# Altium footprint library pre_CONNECTOR.PcbLib: 64 footprints (part 1 of 4)
Each footprint in its own frame and in the unit in brackets; x right, y up, seen from the top. Pads: shape width x height; smd on the part's side, far side on the other; paste and mask are expansions set on the pad; w line width, h text height; cw(c..) or ccw(c..) is an arc to the next point about the centre after c.
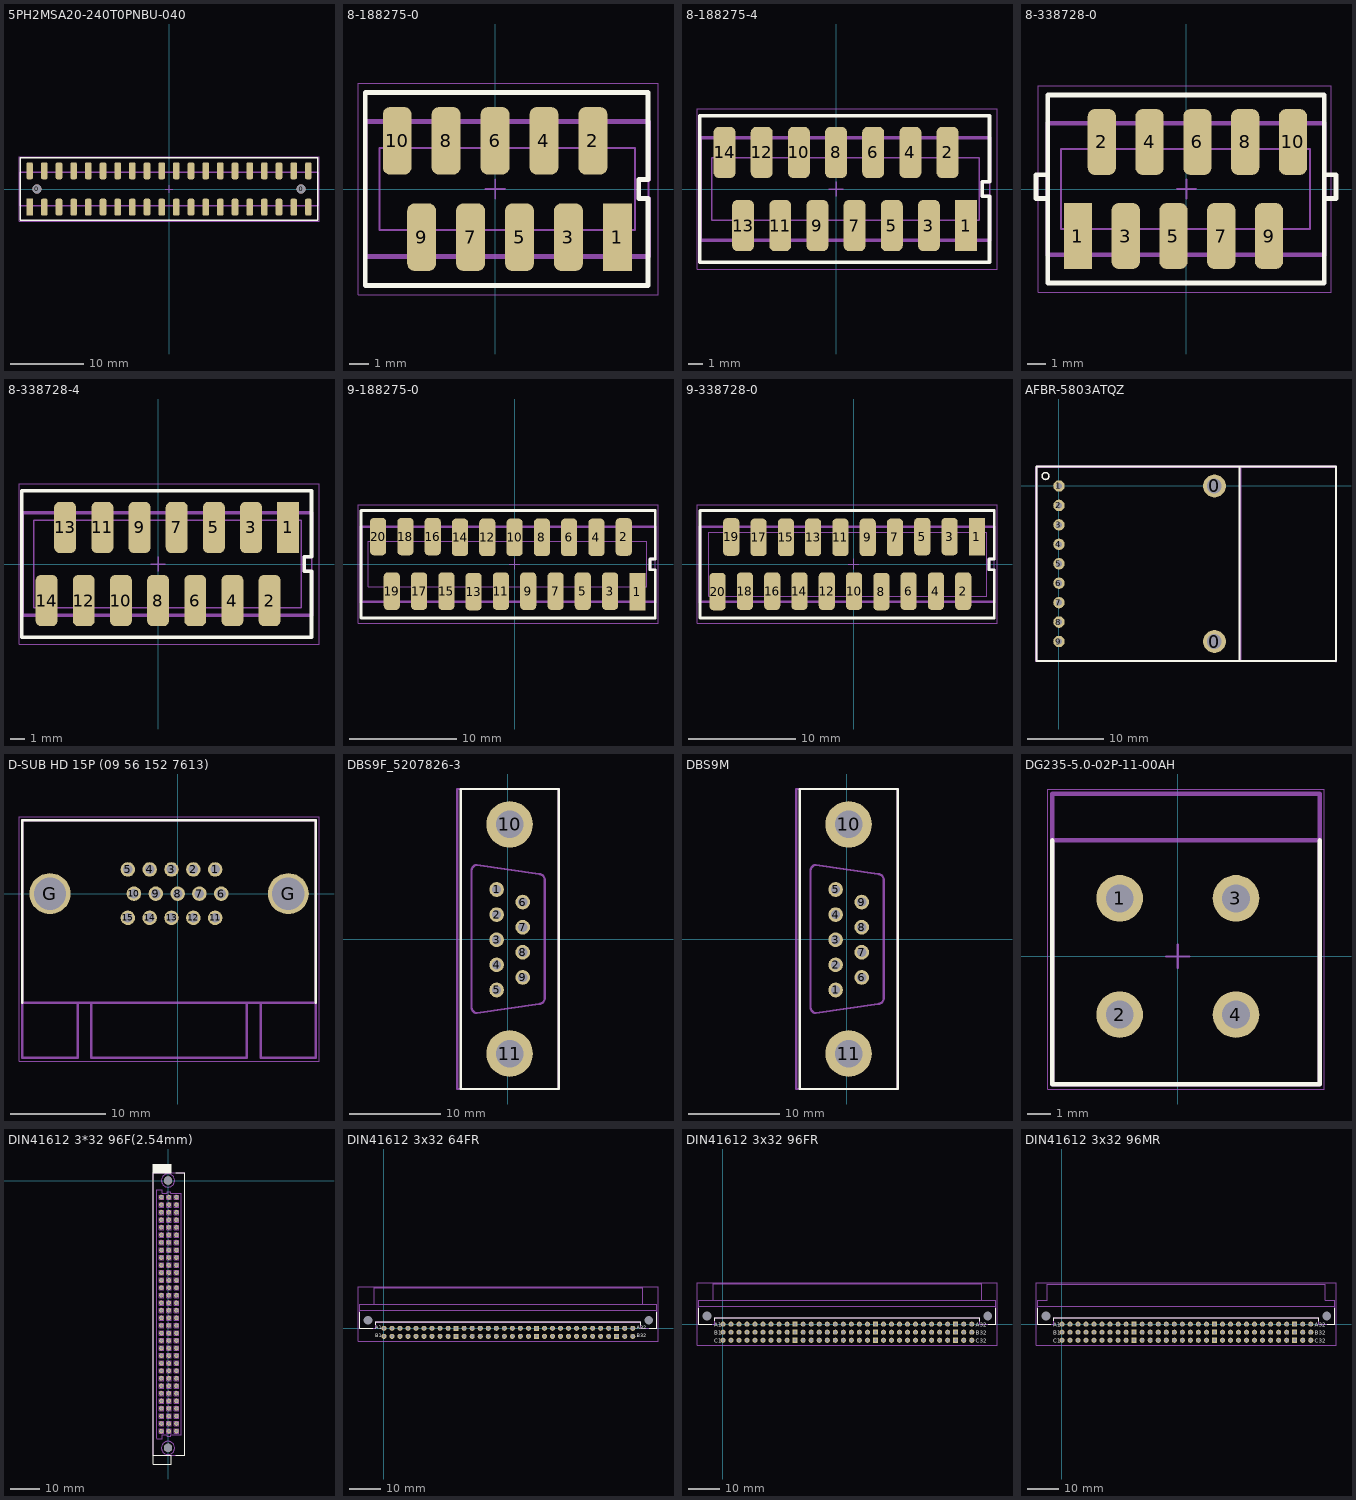
[diagram p0: the footprints below, top view; thin cyan lines are the x and y axes]

## 5PH2MSA20-240T0PNBU-040 [mm] "Female Header, Pitch 2.0mm"
height 6.7
pads (42):
  round 1.2 hole 1.2 unplated: 0(-18,0) 0(18,0)
  rect 0.9x2.3 smd: 1(-19,-2.475)
  rrect50% 0.9x2.3 smd: 2(-19,2.475) 3(-17,-2.475) 4(-17,2.475) 5(-15,-2.475) 6(-15,2.475) 7(-13,-2.475) 8(-13,2.475) 9(-11,-2.475) 10(-11,2.475) 11(-9,-2.475) 12(-9,2.475) 13(-7,-2.475) 14(-7,2.475) 15(-5,-2.475) 16(-5,2.475) 17(-3,-2.475) 18(-3,2.475) 19(-1,-2.475) 20(-1,2.475) 21(1,-2.475) 22(1,2.475) 23(3,-2.475) 24(3,2.475) 25(5,-2.475) 26(5,2.475) 27(7,-2.475) 28(7,2.475) 29(9,-2.475) 30(9,2.475) 31(11,-2.475) 32(11,2.475) 33(13,-2.475) 34(13,2.475) 35(15,-2.475) 36(15,2.475) 37(17,-2.475) 38(17,2.475) 39(19,-2.475) 40(19,2.475)
Top Overlay:
  lines w0.2: -20.3,-4.25 20.3,-4.25 20.3,4.25 -20.3,4.25 -20.3,-4.25
Top Assy:
  lines w0.2: -20.3,-2.25 20.3,-2.25 20.3,2.25 -20.3,2.25 -20.3,-2.25
Mechanical 15:
  lines w0.05: -20.45,-4.4 20.45,-4.4 20.45,4.4 -20.45,4.4 -20.45,-4.4
  lines w0.1: -0.5,0 0.5,0 ; 0,-0.5 0,0.5
3D body: height 6.7, standoff 0, extent -20.3,-2.25 20.3,2.25

## 8-188275-0 [mm]
height 5.25
pads (10):
  rect 1.5x3.5 smd: 1(6.34,-2.5)
  rrect50% 1.5x3.5 smd: 2(5.07,2.5) 3(3.8,-2.5) 4(2.53,2.5) 5(1.26,-2.5) 6(-0.01,2.5) 7(-1.28,-2.5) 8(-2.55,2.5) 9(-3.82,-2.5) 10(-5.09,2.5)
Top Overlay:
  lines w0.254: -6.75,-5 -6.75,5 7.94,5 7.94,0.5 7.45,0.5 7.45,-0.5 7.94,-0.5 7.94,-5 -6.75,-5
Top Assy:
  lines w0.254: -6.75,-3.5 -6.75,3.5 7.95,3.5 7.95,1 7.95,0.5 7.45,0.5 7.45,-0.5 7.95,-0.5 7.95,-3.5 -6.75,-3.5
Mechanical 13:
  lines w0.1: 7.25,-2.13 -6,-2.13 -6,2.13 7.25,2.13 ; 7.25,-2.125 7.25,2.125 ; -6.725,-3.5 7.95,-3.5 7.95,3.5 -6.725,3.5 -6.725,-3.5
Mechanical 15:
  lines w0.05: -7.125,-5.5 8.45,-5.5 8.45,5.5 -7.125,5.5 -7.125,-5.5
  lines w0.1: -0.5,0 0.5,0 ; 0,-0.5 0,0.5
3D body: height 3.35, standoff 0, extent -6.75,-3.5 7.95,3.5
3D body: height 5.25, standoff 3.35, extent -6,-2.125 7.25,2.125

## 8-188275-4 [mm]
height 5.25
pads (14):
  rect 1.5x3.5 smd: 1(8.89,-2.5)
  rrect50% 1.5x3.5 smd: 2(7.62,2.5) 3(6.35,-2.5) 4(5.08,2.5) 5(3.81,-2.5) 6(2.54,2.5) 7(1.27,-2.5) 8(0,2.5) 9(-1.27,-2.5) 10(-2.54,2.5) 11(-3.81,-2.5) 12(-5.08,2.5) 13(-6.35,-2.5) 14(-7.62,2.5)
Top Overlay:
  lines w0.254: -9.31,-5 -9.31,5 10.49,5 10.49,0.5 10,0.5 10,-0.5 10.49,-0.5 10.49,-5 -9.31,-5
Top Assy:
  lines w0.254: -9.3,-3.5 -9.3,3.5 10.5,3.5 10.5,1 10.5,0.5 10,0.5 10,-0.5 10.5,-0.5 10.5,-3.5 -9.3,-3.5
Mechanical 13:
  lines w0.1: -8.5,-2.13 9.8,-2.13 ; -8.5,-2.125 -8.5,2.13 9.8,2.13 ; 9.8,-2.125 9.8,2.125 ; -9.3,-3.5 10.5,-3.5 10.5,3.5 -9.3,3.5 -9.3,-3.5
Mechanical 15:
  lines w0.05: -9.5,-5.5 11,-5.5 11,5.5 -9.5,5.5 -9.5,-5.5
  lines w0.1: -0.5,0 0.5,0 ; 0,-0.5 0,0.5
3D body: height 5.25, standoff 3.35, extent -8.5,-2.125 9.8,2.125
3D body: height 3.35, standoff 0, extent -9.3,-3.5 10.5,3.5

## 8-338728-0 [mm]
pads (10):
  rect 1.5x3.5 smd: 1(-5.77,-2.5)
  rrect50% 1.5x3.5 smd: 2(-4.5,2.5) 3(-3.23,-2.5) 4(-1.96,2.5) 5(-0.69,-2.5) 6(0.58,2.5) 7(1.85,-2.5) 8(3.12,2.5) 9(4.39,-2.5) 10(5.66,2.5)
Top Overlay:
  lines w0.25: -7.37,-0.5 -8,-0.5 -8,0.75 -7.37,0.75 ; 7.32,-0.5 7.95,-0.5 7.95,0.75 7.32,0.75
  lines w0.254: -7.37,-5 7.32,-5 7.32,5 -7.37,5 -7.37,0.5 -7.37,-0.5 -7.37,-5
Top Assy:
  lines w0.254: -7.38,-3.5 -7.38,-0.5 -7.38,0.5 -7.38,1 -7.38,3.5 7.32,3.5 7.32,-3.5 -7.38,-3.5
Mechanical 13:
  lines w0.1: -6.68,-2.13 6.57,-2.13 6.57,2.13 -6.68,2.13 ; -6.68,-2.125 -6.68,2.125 ; -7.38,-3.5 -7.38,3.5 7.295,3.5 7.295,-3.5 -7.38,-3.5
Mechanical 15:
  lines w0.05: -7.88,-5.5 -7.88,5.5 7.695,5.5 7.695,-5.5 -7.88,-5.5
  lines w0.1: -0.5,0 0.5,0 ; 0,-0.5 0,0.5
3D body "c-8-338728-0-e-3d.stp": height 4.6, standoff 0, extent -7.94,-3.25 7.94,3.25

## 8-338728-4 [mm]
height 4.6
pads (14):
  rect 1.5x3.5 smd: 1(8.895,2.5)
  rrect50% 1.5x3.5 smd: 2(7.625,-2.5) 3(6.355,2.5) 4(5.085,-2.5) 5(3.815,2.5) 6(2.545,-2.5) 7(1.275,2.5) 8(0.005,-2.5) 9(-1.265,2.5) 10(-2.535,-2.5) 11(-3.805,2.5) 12(-5.075,-2.5) 13(-6.345,2.5) 14(-7.615,-2.5)
Top Overlay:
  lines w0.254: -9.31,-5 10.49,-5 10.49,-0.5 10,-0.5 10,0.5 10.49,0.5 10.49,5 -9.31,5 -9.31,-5
Top Assy:
  lines w0.254: -9.3,-3.5 10.5,-3.5 10.5,-0.5 10,-0.5 10,0.5 10.5,0.5 10.5,1 10.5,3.5 -9.3,3.5 -9.3,-3.5
Mechanical 13:
  lines w0.1: -9.3,-3.5 -9.3,3.5 10.5,3.5 10.5,-3.5 -9.3,-3.5 ; -8.5,-3 9.8,-3 9.8,3 -8.5,3 -8.5,-3
Mechanical 15:
  lines w0.05: -9.5,-5.5 -9.5,5.5 11,5.5 11,-5.5 -9.5,-5.5
  lines w0.1: -0.5,0 0.5,0 ; 0,-0.5 0,0.5
3D body: height 5.25, standoff 3.35, extent -9.3,-3.5 10.5,-3
3D body: height 5.25, standoff 3.35, extent 9.8,-3 10.5,3
3D body: height 5.25, standoff 3.35, extent -9.3,3 10.5,3.5
3D body: height 5.25, standoff 3.35, extent -9.3,-3 -8.5,3
3D body: height 2.4, standoff 0, extent -9.3,-3.5 10.5,3.5

## 9-188275-0 [mm]
height 5.25
pads (20):
  rect 1.5x3.5 smd: 1(11.43,-2.54)
  rrect50% 1.5x3.5 smd: 2(10.16,2.54) 3(8.89,-2.5) 4(7.62,2.5) 5(6.35,-2.5) 6(5.08,2.5) 7(3.81,-2.5) 8(2.54,2.5) 9(1.27,-2.5) 10(0,2.5) 11(-1.27,-2.5) 12(-2.54,2.5) 13(-3.81,-2.54) 14(-5.08,2.5) 15(-6.35,-2.5) 16(-7.62,2.58) 17(-8.89,-2.5) 18(-10.16,2.58) 19(-11.43,-2.5) 20(-12.7,2.58)
Top Overlay:
  lines w0.254: -14.3,-5 -14.3,5 13.1,5 13.1,0.5 12.6,0.5 12.6,-0.5 13.1,-0.5 13.1,-5 -14.3,-5
Top Assy:
  lines w0.254: -14.3,-3.5 -14.3,3.5 13.1,3.5 13.1,0.5 12.6,0.5 12.6,-0.5 13.1,-0.5 13.1,-3.5 -14.3,-3.5
Mechanical 13:
  lines w0.1: -14.325,-3.475 13.075,-3.475 13.075,3.525 -14.325,3.525 -14.325,-3.475 ; -13.6,-2.105 12.325,-2.105 12.325,2.155 -13.6,2.155 -13.6,-2.105
Mechanical 15:
  lines w0.05: -14.575,-5.475 13.35,-5.475 13.35,5.525 -14.575,5.525 -14.575,-5.475
  lines w0.1: -0.5,0.025 0.5,0.025 ; 0,-0.475 0,0.525
3D body: height 5.25, standoff 3.35, extent -13.6,-2.1 12.325,2.15
3D body: height 3.35, standoff 0, extent -14.3,-3.475 13.075,3.525

## 9-338728-0 [mm]
height 4.6
pads (20):
  rect 1.5x3.5 smd: 1(11.475,2.58)
  rrect50% 1.5x3.5 smd: 2(10.205,-2.5) 3(8.935,2.58) 4(7.665,-2.5) 5(6.395,2.58) 6(5.125,-2.5) 7(3.855,2.5) 8(2.585,-2.54) 9(1.315,2.5) 10(0.045,-2.5) 11(-1.225,2.5) 13(-3.765,2.5) 14(-5.035,-2.5) 15(-6.305,2.5) 16(-7.575,-2.5) 17(-8.845,2.5) 18(-10.115,-2.5) 19(-11.385,2.54) 20(-12.655,-2.54)
  rrect50% 1.5x3.5 smd paste+0: 12(-2.495,-2.5)
Top Overlay:
  lines w0.254: -14.3,-5 13.1,-5 13.1,-0.5 12.6,-0.5 12.6,0.5 13.1,0.5 13.1,5 -14.3,5 -14.3,-5
Top Assy:
  lines w0.254: -14.3,-3.5 13.1,-3.5 13.1,-0.5 12.6,-0.5 12.6,0.5 13.1,0.5 13.1,3.5 -14.3,3.5 -14.3,-3.5
Mechanical 13:
  lines w0.1: -14.325,-3.475 -14.325,3.525 13.075,3.525 13.075,-3.475 -14.325,-3.475 ; -13.5,-3 12.375,-3 12.375,3 -13.5,3 -13.5,-3
Mechanical 15:
  lines w0.05: -14.575,-5.475 -14.575,5.525 13.35,5.525 13.35,-5.475 -14.575,-5.475
  lines w0.1: -0.5,0.025 0.5,0.025 ; 0,-0.475 0,0.525
3D body: height 5.25, standoff 3.35, extent -14.275,-3.5 13.075,-3
3D body: height 5.25, standoff 3.35, extent 12.35,-3 13.05,3
3D body: height 5.25, standoff 3.35, extent -14.3,3 13.1,3.5
3D body: height 5.25, standoff 3.35, extent -14.3,-3 -13.5,3
3D body: height 2.4, standoff 0, extent -14.275,-3.5 13.05,3.5

## AFBR-5803ATQZ [mm] "D?"
height 11.1
pads (11):
  round 3 hole 1.9: 0(20.32,-20.32) 0(20.32,0)
  round 1.5 hole 0.8: 1(0,0) 2(0,-2.54) 3(0,-5.08) 4(0,-7.62) 5(0,-10.16) 6(0,-12.7) 7(0,-15.24) 8(0,-17.78) 9(0,-20.32)
Top Overlay:
  circle w0.2: c-1.75,1.3 r0.45
  lines w0.254: 23.59,-22.85 23.59,2.54 ; -2.93,-22.86 36.18,-22.86 36.19,-22.85 36.19,2.54 -2.92,2.54 -2.92,-22.85 ; -2.93,-22.86 -2.92,-22.85 ; -2.93,-22.86 -2.92,-22.85
Top Assy:
  lines w0.254: 36.175,-22.875 -2.925,-22.875 -2.925,2.525 36.175,2.525 ; 36.2,-22.925 36.2,2.475
Mechanical 13:
  lines w0.25: 23.75,-22.75 23.75,2.54 ; -3,-22.86 -3,-16.52 -3,-3.84 -3,2.5 36.2,2.5 36.2,-22.86 -3,-22.86
3D body: height 11.1, standoff 0, extent -2.9,-22.8 36.2,2.5

## D-SUB HD 15P (09 56 152 7613) [mm] "D-SUB HD 15P (09 56 152 7613)"
height 12.55
pads (17):
  round 1.524 hole 1: 1(3.94,2.54) 2(1.65,2.54) 3(-0.64,2.54) 4(-2.93,2.54) 5(-5.22,2.54) 6(4.58,0) 7(2.29,0) 8(0,0) 9(-2.29,0) 10(-4.58,0) 11(3.94,-2.54) 12(1.65,-2.54) 13(-0.64,-2.54) 14(-2.93,-2.54) 15(-5.22,-2.54)
  round 4.3 hole 3.4: G(-13.39,0) G(11.61,0)
Top Overlay:
  lines w0.254: -16.29,-11.43 -16.29,7.695 14.51,7.695 14.51,-11.43
Top Assy:
  lines w0.254: -16.29,-11.43 14.51,-11.43 ; -16.29,7.665 -16.29,-17.23 -10.49,-17.23 -10.49,-11.43 ; -16.24,7.685 14.485,7.685 14.51,7.66 14.51,-17.23 8.71,-17.23 8.71,-11.43 7.27,-11.43 7.27,-17.23 -9.05,-17.23 -9.05,-11.43 ; -10.48,-11.43 -9.04,-11.43
Mechanical 13:
  lines w0.254: -16.29,-11.43 -10.49,-11.43 -10.49,-17.23 -16.29,-17.23 -16.29,-11.43 ; -16.29,-11.43 14.51,-11.43 ; -16.29,-11.43 -16.29,7.695 14.51,7.695 14.51,-11.43 ; 14.51,-11.43 14.51,-17.23 8.71,-17.23 8.71,-11.43 14.51,-11.43 ; -9.04,-17.23 -9.04,-11.43 7.26,-11.43 7.26,-17.205 7.285,-17.23 -9.04,-17.23
Mechanical 15:
  lines w0.05: -16.64,-17.58 -16.64,8.07 14.835,8.07 14.835,-17.58 -16.64,-17.58
3D body: height 12.55, standoff 0, extent -16.24,-11.455 14.51,7.67
3D body: height 8.65, standoff 3.9, extent 8.66,-17.344 14.46,-11.467
3D body: height 8.65, standoff 3.9, extent -16.217,-17.117 -10.465,-11.342
3D body: height 10.23, standoff 2.32, extent -9.04,-17.23 7.16,-11.43

## DBS9F_5207826-3 [mm]
pads (11):
  round 1.6 hole 1: 1(-1.22,5.4) 2(-1.22,2.66) 3(-1.22,-0.08) 4(-1.22,-2.82) 5(-1.22,-5.56) 6(1.62,4.03) 7(1.62,1.29) 8(1.62,-1.45) 9(1.62,-4.19)
  round 5.08 hole 3: 10(0.2,12.5) 11(0.2,-12.49)
Top Overlay:
  lines w0.25: -5.14,-16.36 -5.14,16.36 5.54,16.36 5.54,-16.36 -5.14,-16.36
Mechanical 13:
  lines w0.25: -3.353,-8.081 cw(c-3.314,-7.425) -3.97,-7.4 -3.97,7.4 cw(c-3.314,7.425) -3.353,8.081 ; -3.35,-8.08 3.41,-7.09 ; -3.35,8.08 3.41,7.09 ; 3.413,-7.091 ccw(c3.374,-6.435) 4.03,-6.41 4.03,6.41 ccw(c3.374,6.435) 3.413,7.091 ; -5.5,-16.36 5.54,-16.36 5.54,16.36 -5.5,16.36 -5.5,-16.36
3D body: height 6, standoff 0, extent -5.15,-16.3 5.55,16.4
3D body: height 12, standoff 6, extent -4,-8.15 4,8.15

## DBS9M [mm]
pads (11):
  round 1.6 hole 1: 1(-1.22,-5.56) 2(-1.22,-2.82) 3(-1.22,-0.08) 4(-1.22,2.66) 5(-1.22,5.4) 6(1.62,-4.19) 7(1.62,-1.45) 8(1.62,1.29) 9(1.62,4.03)
  round 5.08 hole 3: 10(0.2,12.5) 11(0.2,-12.49)
Top Overlay:
  lines w0.25: -5.14,-16.36 -5.14,16.36 5.54,16.36 5.54,-16.36 -5.14,-16.36
Mechanical 13:
  lines w0.25: -3.353,-8.081 cw(c-3.314,-7.425) -3.97,-7.4 -3.97,7.4 cw(c-3.314,7.425) -3.353,8.081 ; -3.35,-8.08 3.41,-7.09 ; -3.35,8.08 3.41,7.09 ; 3.413,-7.091 ccw(c3.374,-6.435) 4.03,-6.41 4.03,6.41 ccw(c3.374,6.435) 3.413,7.091 ; -5.5,-16.36 5.54,-16.36 5.54,16.36 -5.5,16.36 -5.5,-16.36
3D body: height 6, standoff 0, extent -5.15,-16.3 5.55,16.4
3D body: height 12, standoff 6, extent -4,-8.15 4,8.15

## DG235-5.0-02P-11-00AH [mm]
height 15.5
pads (4):
  round 2 hole 1.2: 1(-2.5,2.5) 2(-2.5,-2.5) 3(2.5,2.5) 4(2.5,-2.5)
Top Overlay:
  lines w0.2: -5.4,5 -5.4,-5.5 6.1,-5.5 6.1,5
Top Assy:
  lines w0.2: -5.4,5 6.1,5 ; -5.4,-5.5 6.1,-5.5 6.1,7 -5.4,7 -5.4,-5.5
Mechanical 13:
  lines w0.2: -5.4,-5.5 -5.4,7 6.1,7 6.1,-5.5 -5.4,-5.5
Mechanical 15:
  lines w0.05: -5.6,-5.7 6.3,-5.7 6.3,7.2 -5.6,7.2 -5.6,-5.7
  lines w0.1: -0.5,0 0.5,0 ; 0,-0.5 0,0.5
3D body: height 15.5, standoff 0, extent -5.5,-5.6 6.2,7.1

## DIN41612 3*32 96F(2.54mm) [mm]
pads (98):
  round 2.8 hole 2.8 unplated: 97(0,0) 98(0,-90)
  round 1.5 hole 1: a1(-2.24,-5.63) a2(-2.24,-8.17) a3(-2.24,-10.71) a4(-2.24,-13.25) a5(-2.24,-15.79) a6(-2.24,-18.33) a7(-2.24,-20.87) a8(-2.24,-23.41) a9(-2.24,-25.95) a10(-2.24,-28.49) a11(-2.24,-31.03) a12(-2.24,-33.57) a13(-2.24,-36.11) a14(-2.24,-38.65) a15(-2.24,-41.19) a16(-2.24,-43.73) a17(-2.24,-46.27) a18(-2.24,-48.81) a19(-2.24,-51.35) a20(-2.24,-53.89) a21(-2.24,-56.43) a22(-2.24,-58.97) a23(-2.24,-61.51) a24(-2.24,-64.05) a25(-2.24,-66.59) a26(-2.24,-69.13) a27(-2.24,-71.67) a28(-2.24,-74.21) a29(-2.24,-76.75) a30(-2.24,-79.29) a31(-2.24,-81.83) a32(-2.24,-84.37) b1(0.3,-5.63) b2(0.3,-8.17) b3(0.3,-10.71) b4(0.3,-13.25) b5(0.3,-15.79) b6(0.3,-18.33) b7(0.3,-20.87) b8(0.3,-23.41) b9(0.3,-25.95) b10(0.3,-28.49) b11(0.3,-31.03) b12(0.3,-33.57) b13(0.3,-36.11) b14(0.3,-38.65) b15(0.3,-41.19) b16(0.3,-43.73) b17(0.3,-46.27) b18(0.3,-48.81) b19(0.3,-51.35) b20(0.3,-53.89) b21(0.3,-56.43) b22(0.3,-58.97) b23(0.3,-61.51) b24(0.3,-64.05) b25(0.3,-66.59) b26(0.3,-69.13) b27(0.3,-71.67) b28(0.3,-74.21) b29(0.3,-76.75) b30(0.3,-79.29) b31(0.3,-81.83) b32(0.3,-84.37) c1(2.84,-5.63) c2(2.84,-8.17) c3(2.84,-10.71) c4(2.84,-13.25) c5(2.84,-15.79) c6(2.84,-18.33) c7(2.84,-20.87) c8(2.84,-23.41) c9(2.84,-25.95) c10(2.84,-28.49) c11(2.84,-31.03) c12(2.84,-33.57) c13(2.84,-36.11) c14(2.84,-38.65) c15(2.84,-41.19) c16(2.84,-43.73) c17(2.84,-46.27) c18(2.84,-48.81) c19(2.84,-51.35) c20(2.84,-53.89) c21(2.84,-56.43) c22(2.84,-58.97) c23(2.84,-61.51) c24(2.84,-64.05) c25(2.84,-66.59) c26(2.84,-69.13) c27(2.84,-71.67) c28(2.84,-74.21) c29(2.84,-76.75) c30(2.84,-79.29) c31(2.84,-81.83) c32(2.84,-84.37)
Top Overlay:
  lines w0.25: -4.91,2.56 -4.91,5.56 1.09,5.56 1.09,2.57 -4.91,2.57 ; -4.907,-92.434 -4.907,2.562 ; -4.9,-92.44 -4.9,-95.44 1.1,-95.44 1.1,-92.43 -4.9,-92.43 ; 2.586,-92.434 5.57,-92.434 5.57,2.562 2.586,2.562
  lines w1: -4.49,5.11 -4.49,2.99 -4.48,2.99 ; -4.48,5.02 0.66,5.02 0.66,4.11 -4.46,4.11 -4.46,3.15 0.67,3.15 0.67,3.1 ; -4.45,4.97 -4.43,4.97 ; 0.67,5.13 0.67,3.01 0.69,3.01
Mechanical 2:
  drawing of 207 lines, arcs and shapes, not listed
Mechanical 13:
  drawing of 417 lines, arcs and shapes, not listed
3D body "connector_a-cf96abct.stp": height 11.62, standoff -3.98, extent -4.919,-92.458 5.681,2.542

## DIN41612 3x32 64FR [mm] "96-Pin DIN Standard Right Angle Male PCB Mount Connector Розетка"
height 9.5
pads (66):
  round 0 hole 2.8 unplated mask+1.5: 0(-5.08,2.54) 0(83.82,2.54)
  round 1.6 hole 1: A1(0,0) A2(2.54,0) A3(5.08,0) A4(7.62,0) A5(10.16,0) A6(12.7,0) A7(15.24,0) A8(17.78,0) A9(20.32,0) A11(25.4,0) A12(27.94,0) A13(30.48,0) A14(33.02,0) A15(35.56,0) A16(38.1,0) A17(40.64,0) A18(43.18,0) A19(45.72,0) A21(50.8,0) A22(53.34,0) A23(55.88,0) A24(58.42,0) A25(60.96,0) A26(63.5,0) A27(66.04,0) A28(68.58,0) A29(71.12,0) A31(76.2,0) A32(78.74,0) B1(0,-2.54) B2(2.54,-2.54) B3(5.08,-2.54) B4(7.62,-2.54) B5(10.16,-2.54) B6(12.7,-2.54) B7(15.24,-2.54) B8(17.78,-2.54) B9(20.32,-2.54) B11(25.4,-2.54) B12(27.94,-2.54) B13(30.48,-2.54) B14(33.02,-2.54) B15(35.56,-2.54) B16(38.1,-2.54) B17(40.64,-2.54) B18(43.18,-2.54) B19(45.72,-2.54) B21(50.8,-2.54) B22(53.34,-2.54) B23(55.88,-2.54) B24(58.42,-2.54) B25(60.96,-2.54) B26(63.5,-2.54) B27(66.04,-2.54) B28(68.58,-2.54) B29(71.12,-2.54) B31(76.2,-2.54) B32(78.74,-2.54)
  rect 1.6x1.6 hole 1: A10(22.86,0) A20(48.26,0) A30(73.66,0) B10(22.86,-2.54) B20(48.26,-2.54) B30(73.66,-2.54)
Top Overlay:
  lines w0.2: -7.62,5 -7.62,0 -3.6,0 ; -2.54,1.06 -2.54,2 81.28,2 81.28,0.92 ; 84,0 86.36,0 86.36,5
  text "A1" at -2.8,-0.75 h2
  text "B1" at -2.8,-3.3 h2
  text "A32" at 80,-0.75 h2
  text "B32" at 80,-3.3 h2
Bottom Overlay:
  lines w0.2: -7.62,5 -7.62,0 -2.54,0 -2.54,-4.061 81.28,-4.061 81.28,0 86.36,0 86.36,5
Top Assy:
  lines w0.254: -7.625,0 -2.525,0 ; -7.62,0.025 -7.62,7.525 ; -7.62,5.7 86.36,5.7 ; -7.605,7.55 -3.125,7.55 ; -3.125,7.575 -3.125,12.75 81.85,12.75 81.85,7.55 86.36,7.55 ; -2.555,1.975 81.25,1.975 ; -2.55,0 -2.55,1.975 ; 81.275,0 81.275,1.95 ; 81.3,0 86.3,0 ; 86.36,0 86.36,7.505
Mechanical 13:
  lines w0.2: -7.62,5.7 86.36,5.7 ; -7.62,7.54 -7.62,0 -2.54,0 -2.54,2 81.28,2 81.28,0 86.36,0 86.36,7.54 81.85,7.54 ; -7.6,7.54 -3.125,7.54 ; -3.125,7.54 81.85,7.54 ; -3.125,7.54 -3.125,12.75 81.85,12.75 81.85,7.54
Mechanical 15:
  lines w0.05: -8.2,-4.028 86.725,-4.028 86.725,13.1 -8.2,13.1 -8.2,-4.028
  lines w0.1: -0.5,0.025 0.5,0.025 ; 0,-0.5 0,0.5
3D body "din_41612_female_q-64abr.stp": height 7.05, standoff -3, extent -7.484,-2.845 86.516,12.725

## DIN41612 3x32 96FR [mm] "96-Pin DIN Standard Right Angle Male PCB Mount Connector Розетка"
height 9.5
pads (98):
  round 0 hole 2.8 unplated mask+1.5: 0(-5.08,2.54) 0(83.82,2.54)
  round 1.6 hole 1: A1(0,0) A2(2.54,0) A3(5.08,0) A4(7.62,0) A5(10.16,0) A6(12.7,0) A7(15.24,0) A8(17.78,0) A9(20.32,0) A11(25.4,0) A12(27.94,0) A13(30.48,0) A14(33.02,0) A15(35.56,0) A16(38.1,0) A17(40.64,0) A18(43.18,0) A19(45.72,0) A21(50.8,0) A22(53.34,0) A23(55.88,0) A24(58.42,0) A25(60.96,0) A26(63.5,0) A27(66.04,0) A28(68.58,0) A29(71.12,0) A31(76.2,0) A32(78.74,0) B1(0,-2.54) B2(2.54,-2.54) B3(5.08,-2.54) B4(7.62,-2.54) B5(10.16,-2.54) B6(12.7,-2.54) B7(15.24,-2.54) B8(17.78,-2.54) B9(20.32,-2.54) B11(25.4,-2.54) B12(27.94,-2.54) B13(30.48,-2.54) B14(33.02,-2.54) B15(35.56,-2.54) B16(38.1,-2.54) B17(40.64,-2.54) B18(43.18,-2.54) B19(45.72,-2.54) B21(50.8,-2.54) B22(53.34,-2.54) B23(55.88,-2.54) B24(58.42,-2.54) B25(60.96,-2.54) B26(63.5,-2.54) B27(66.04,-2.54) B28(68.58,-2.54) B29(71.12,-2.54) B31(76.2,-2.54) B32(78.74,-2.54) C1(0,-5.08) C2(2.54,-5.08) C3(5.08,-5.08) C4(7.62,-5.08) C5(10.16,-5.08) C6(12.7,-5.08) C7(15.24,-5.08) C8(17.78,-5.08) C9(20.32,-5.08) C11(25.4,-5.08) C12(27.94,-5.08) C13(30.48,-5.08) C14(33.02,-5.08) C15(35.56,-5.08) C16(38.1,-5.08) C17(40.64,-5.08) C18(43.18,-5.08) C19(45.72,-5.08) C21(50.8,-5.08) C22(53.34,-5.08) C23(55.88,-5.08) C24(58.42,-5.08) C25(60.96,-5.08) C26(63.5,-5.08) C27(66.04,-5.08) C28(68.58,-5.08) C29(71.12,-5.08) C31(76.2,-5.08) C32(78.74,-5.08)
  rect 1.6x1.6 hole 1: A10(22.86,0) A20(48.26,0) A30(73.66,0) B10(22.86,-2.54) B20(48.26,-2.54) B30(73.66,-2.54) C10(22.86,-5.08) C20(48.26,-5.08) C30(73.66,-5.08)
Top Overlay:
  lines w0.2: -7.62,5 -7.62,0 -3.6,0 ; -2.54,1.06 -2.54,2 81.28,2 81.28,0.92 ; 84,0 86.36,0 86.36,5
  text "A1" at -2.8,-0.75 h1.3
  text "B1" at -2.8,-3.3 h1.3
  text "C1" at -2.8,-5.85 h1.3
  text "A32" at 80,-0.75 h1.3
  text "B32" at 80,-3.3 h1.3
  text "C32" at 80,-5.85 h1.3
Bottom Overlay:
  lines w0.2: -7.62,5 -7.62,0 -2.54,0 -2.54,-6.15 81.28,-6.15 81.28,0 86.36,0 86.36,5
Top Assy:
  lines w0.254: -7.625,0 -2.525,0 ; -7.62,0.025 -7.62,7.525 ; -7.62,5.7 86.36,5.7 ; -7.605,7.55 -3.125,7.55 ; -3.125,7.575 -3.125,12.75 81.85,12.75 81.85,7.55 86.36,7.55 ; -2.555,1.975 81.25,1.975 ; -2.55,0 -2.55,1.975 ; 81.275,0 81.275,1.95 ; 81.3,0 86.3,0 ; 86.36,0 86.36,7.505
Mechanical 13:
  lines w0.2: -7.62,5.7 86.36,5.7 ; -7.62,7.54 -7.62,0 -2.54,0 -2.54,2 81.28,2 81.28,0 86.36,0 86.36,7.54 81.85,7.54 ; -7.6,7.54 -3.125,7.54 ; -3.125,7.54 81.85,7.54 ; -3.125,7.54 -3.125,12.75 81.85,12.75 81.85,7.54
Mechanical 15:
  lines w0.05: -8.2,-6.65 86.725,-6.65 86.725,13.1 -8.2,13.1 -8.2,-6.65
  lines w0.1: -0.5,0.025 0.5,0.025 ; 0,-0.5 0,0.5
3D body: height 8.5, standoff 0, extent -3.124,7.541 81.849,12.749
3D body: height 6, standoff 0, extent 81.28,0 86.36,5.7
3D body: height 7.9, standoff 0, extent -2.54,2 81.3,5.7
3D body: height 9.5, standoff -1.7, extent -7.62,5.7 86.36,7.54
3D body: height 4, standoff 0, extent -7.62,0 -2.5,5.7

## DIN41612 3x32 96MR [mm] "96-Pin DIN Standard Right Angle Male PCB Mount Connector Вилка"
height 9.4
pads (98):
  round 0 hole 2.8 unplated mask+1.5: 0(-5.08,2.54) 0(83.82,2.54)
  round 1.6 hole 1: A1(0,0) A2(2.54,0) A3(5.08,0) A4(7.62,0) A5(10.16,0) A6(12.7,0) A7(15.24,0) A8(17.78,0) A9(20.32,0) A11(25.4,0) A12(27.94,0) A13(30.48,0) A14(33.02,0) A15(35.56,0) A16(38.1,0) A17(40.64,0) A18(43.18,0) A19(45.72,0) A21(50.8,0) A22(53.34,0) A23(55.88,0) A24(58.42,0) A25(60.96,0) A26(63.5,0) A27(66.04,0) A28(68.58,0) A29(71.12,0) A31(76.2,0) A32(78.74,0) B1(0,-2.54) B2(2.54,-2.54) B3(5.08,-2.54) B4(7.62,-2.54) B5(10.16,-2.54) B6(12.7,-2.54) B7(15.24,-2.54) B8(17.78,-2.54) B9(20.32,-2.54) B11(25.4,-2.54) B12(27.94,-2.54) B13(30.48,-2.54) B14(33.02,-2.54) B15(35.56,-2.54) B16(38.1,-2.54) B17(40.64,-2.54) B18(43.18,-2.54) B19(45.72,-2.54) B21(50.8,-2.54) B22(53.34,-2.54) B23(55.88,-2.54) B24(58.42,-2.54) B25(60.96,-2.54) B26(63.5,-2.54) B27(66.04,-2.54) B28(68.58,-2.54) B29(71.12,-2.54) B31(76.2,-2.54) B32(78.74,-2.54) C1(0,-5.08) C2(2.54,-5.08) C3(5.08,-5.08) C4(7.62,-5.08) C5(10.16,-5.08) C6(12.7,-5.08) C7(15.24,-5.08) C8(17.78,-5.08) C9(20.32,-5.08) C11(25.4,-5.08) C12(27.94,-5.08) C13(30.48,-5.08) C14(33.02,-5.08) C15(35.56,-5.08) C16(38.1,-5.08) C17(40.64,-5.08) C18(43.18,-5.08) C19(45.72,-5.08) C21(50.8,-5.08) C22(53.34,-5.08) C23(55.88,-5.08) C24(58.42,-5.08) C25(60.96,-5.08) C26(63.5,-5.08) C27(66.04,-5.08) C28(68.58,-5.08) C29(71.12,-5.08) C31(76.2,-5.08) C32(78.74,-5.08)
  rect 1.6x1.6 hole 1: A10(22.86,0) A20(48.26,0) A30(73.66,0) B10(22.86,-2.54) B20(48.26,-2.54) B30(73.66,-2.54) C10(22.86,-5.08) C20(48.26,-5.08) C30(73.66,-5.08)
Top Overlay:
  lines w0.2: -7.62,5 -7.62,0 -3.6,0 ; -2.54,1.06 -2.54,2 81.28,2 81.28,0.92 ; 84,0 86.36,0 86.36,5
  text "A1" at -2.8,-0.75 h1.3
  text "B1" at -2.8,-3.3 h1.3
  text "C1" at -2.8,-5.85 h1.3
  text "A32" at 80,-0.75 h1.3
  text "B32" at 80,-3.3 h1.3
  text "C32" at 80,-5.85 h1.3
Bottom Overlay:
  lines w0.2: -7.62,5 -7.62,0 -2.54,0 -2.54,-6.15 81.28,-6.15 81.28,0 86.36,0 86.36,5
Top Assy:
  lines w0.254: -7.625,0 -2.525,0 ; -7.625,0.025 -7.625,7.525 ; -7.605,7.55 -4.625,7.55 ; -7.555,5.7 86.325,5.7 ; -4.625,7.575 -4.625,12.63 ; -4.625,12.675 83.35,12.675 ; -2.555,1.975 81.25,1.975 ; -2.55,0 -2.55,1.975 ; 81.275,0 81.275,1.95 ; 81.3,0 86.3,0 ; 83.35,12.65 83.35,7.55 86.33,7.55 ; 86.325,0 86.325,7.505
Mechanical 13:
  lines w0.2: -7.62,5.7 86.36,5.7 ; -7.62,7.54 -7.62,0 -2.54,0 -2.54,2 81.28,2 81.28,0 86.36,0 86.36,7.54 83.37,7.54 83.37,12.65 -4.63,12.65 -4.63,7.54 -7.6,7.54
Mechanical 15:
  lines w0.05: -8.2,-6.65 86.725,-6.65 86.725,13.1 -8.2,13.1 -8.2,-6.65
  lines w0.1: -0.5,0.025 0.5,0.025 ; 0,-0.5 0,0.5
3D body: height 6, standoff 0, extent 81.28,0 86.36,5.7
3D body: height 4, standoff 0, extent -7.62,0 -2.5,5.7
3D body: height 7.9, standoff 0, extent -2.54,2 81.3,5.7
3D body: height 9.4, standoff -1.7, extent -7.62,5.7 86.36,12.65